# Altium footprint library PcbLib1.PcbLib: 51 footprints (part 4 of 4)
Each footprint in its own frame and in the unit in brackets; x right, y up, seen from the top. Pads: shape width x height; smd on the part's side, far side on the other; paste and mask are expansions set on the pad; w line width, h text height; cw(c..) or ccw(c..) is an arc to the next point about the centre after c.
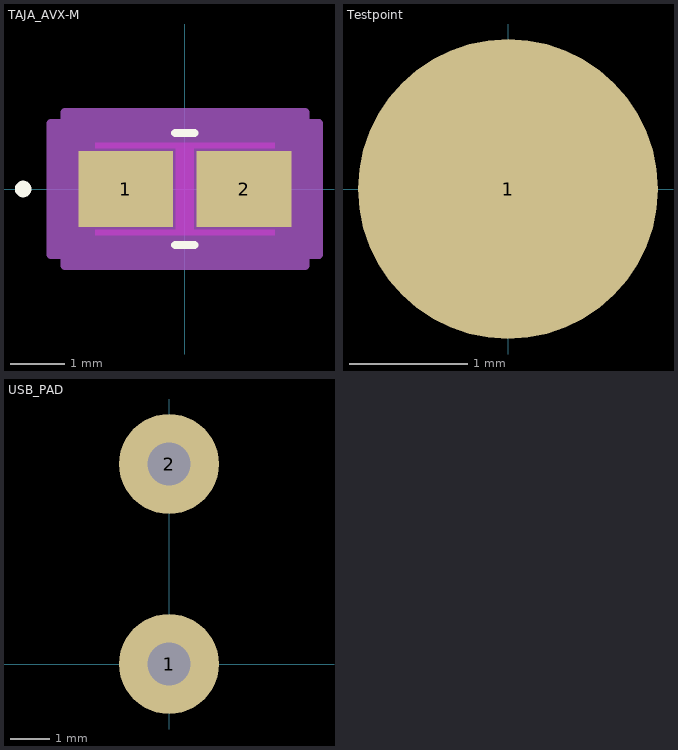
[diagram p3: the footprints below, top view; thin cyan lines are the x and y axes]

## TAJA_AVX-M [mil]
pads (2):
  rect 68.44x55 smd paste+0 mask+0: 1(-42.78,0) 2(42.78,0)
Top Layer keep-out:
  region: -65,-33.5 -65,-29.5 65,-29.5 65,-33.5
  region: -65,29.5 -65,33.5 65,33.5 65,29.5
  region: -6.56,-29.5 -6.56,29.5 6.56,29.5 6.56,-29.5
Top Overlay:
  circle w6: c-117,0 r3
  lines w6: -6.95,-40.5 6.95,-40.5 ; -6.95,40.5 6.95,40.5
Keep-Out Layer:
  region: -6.56,-29.5 -6.56,29.5 6.56,29.5 6.56,-29.5
Mechanical 13:
  circle w0: c-57,0 r3
  lines w1: -67,-35.5 -67,35.5 67,35.5 67,-35.5 -67,-35.5
Mechanical 15:
  region: -87,-47.5 -97,-47.5 -97,47.5 -87,47.5 -87,55.5 87,55.5 87,47.5 97,47.5 97,-47.5 87,-47.5 87,-55.5 -87,-55.5
  lines w6: -97,-47.5 -87,-47.5 -87,-55.5 87,-55.5 87,-47.5 97,-47.5 97,47.5 87,47.5 87,55.5 -87,55.5 -87,47.5 -97,47.5 -97,-47.5
3D body "TAJA_AVX.step": height 72.99, standoff 0, extent -67.01,-35.51 67.01,35.51

## Testpoint [mil]
pads (1):
  round 100 smd: 1(0,0)

## USB_PAD [mil]
pads (2):
  round 100 hole 43: 1(0,0) 2(0,200)